# Altium footprint library Module.PcbLib: 63 footprints (part 1 of 4)
Each footprint in its own frame and in the unit in brackets; x right, y up, seen from the top. Pads: shape width x height; smd on the part's side, far side on the other; paste and mask are expansions set on the pad; w line width, h text height; cw(c..) or ccw(c..) is an arc to the next point about the centre after c.
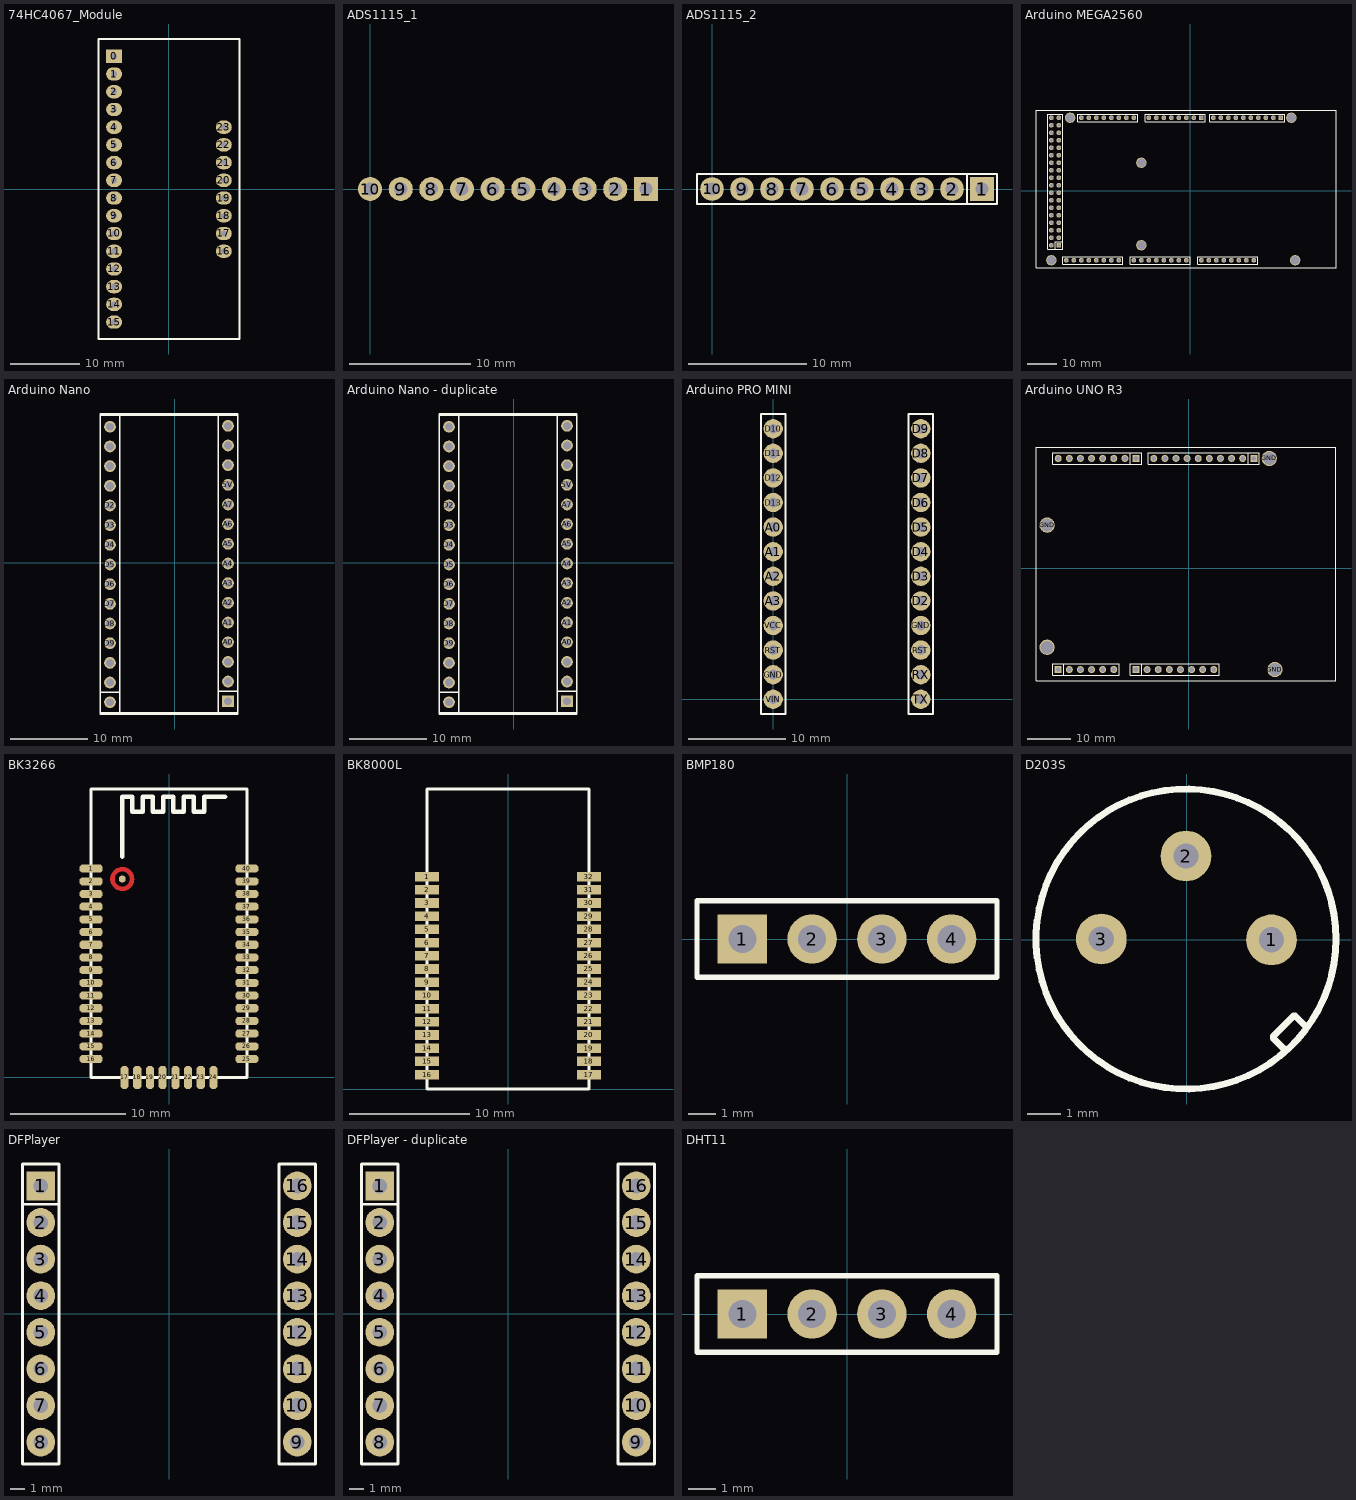
[diagram p0: the footprints below, top view; thin cyan lines are the x and y axes]

## 74HC4067_Module [mil]
pads (24):
  rect 90x75 hole 34: 0(-309.7,748.94)
  oval 90x75 hole 34: 1(-309.7,648.94) 2(-309.7,548.94) 3(-309.7,448.94) 4(-309.7,348.94) 5(-309.7,248.94) 6(-309.7,148.94) 7(-309.7,48.94) 8(-309.7,-51.06) 9(-309.7,-151.06) 10(-309.7,-251.06) 11(-309.7,-351.06) 12(-309.7,-451.06) 13(-309.7,-551.06) 14(-309.7,-651.06) 15(-309.7,-751.06) 16(309.3,-351.06) 17(309.3,-251.06) 18(309.3,-151.06) 19(309.3,-51.06) 20(309.3,48.94) 21(309.3,148.94) 22(309.3,248.94) 23(309.3,348.94)
Top Overlay:
  lines w10: -398.39,-846.46 398.39,-846.46 398.39,846.46 -398.39,846.46 -398.39,-846.46
3D body "Assem4.STEP": height 386.03, standoff -90.35, extent -359.01,-807.09 359.01,807.09

## ADS1115_1 [mm] "ADC 16bit 4Ch"
pads (10):
  rect 2x2 hole 1.1: 1(22.86,0)
  round 2 hole 1.1: 2(20.32,0) 3(17.78,0) 4(15.24,0) 5(12.7,0) 6(10.16,0) 7(7.62,0) 8(5.08,0) 9(2.54,0) 10(0,0)
3D body "61301011021.stp": height 8.37, standoff -1.99, extent -1.295,-1.27 24.105,4.27
3D body "16Bit I2C ADC+PGA - ADS1115.stp": height -6.36, standoff -23.64, extent -2.54,1.6 25.4,4.34

## ADS1115_2 [mm] "ADC 16bit 4Ch"
pads (10):
  rect 2x2 hole 1.1: 1(22.86,0)
  round 2 hole 1.1: 2(20.32,0) 3(17.78,0) 4(15.24,0) 5(12.7,0) 6(10.16,0) 7(7.62,0) 8(5.08,0) 9(2.54,0) 10(0,0)
Top Overlay:
  lines w0.2: 21.59,-1.27 21.59,1.27 ; -1.27,-1.27 22.225,-1.27 24.13,-1.27 24.13,1.27 -1.27,1.27 -1.27,-1.27
3D body "16Bit I2C ADC+PGA - ADS1115.stp": height -6, standoff -8.74, extent -2.54,-15.215 25.4,2.057
3D body "61301011121.stp": height 8.54, standoff -3, extent -1.27,-1.27 24.13,1.27

## Arduino MEGA2560 [mm]
height 8.5
pads (98):
  round 1.6 hole 1.1: 0-RX(-13.97,24.765) 1-TX(-11.43,24.765) 2(-8.89,24.765) 3V3(13.97,-23.495) 4(-3.81,24.765) 5V(-46.99,24.765) 5V(-44.45,24.765) 5V(11.43,-23.495) 8(7.874,24.765) 12(18.034,24.765) 13(20.574,24.765) 14(-19.05,24.765) 15(-21.59,24.765) 16(-24.13,24.765) 17(-26.67,24.765) 18(-29.21,24.765) 19(-31.75,24.765) 20(-34.29,24.765) 21(-36.83,24.765) 22(-44.45,22.225) 23(-46.99,22.225) 24(-44.45,19.685) 25(-46.99,19.685) 26(-44.45,17.145) 27(-46.99,17.145) 28(-44.45,14.605) 29(-46.99,14.605) 30(-44.45,12.065) 31(-46.99,12.065) 32(-44.45,9.525) 33(-46.99,9.525) 34(-44.45,6.985) 35(-46.99,6.985) 36(-44.45,4.445) 37(-46.99,4.445) 38(-44.45,1.905) 39(-46.99,1.905) 40(-44.45,-0.635) 41(-46.99,-0.635) 42(-44.45,-3.175) 43(-46.99,-3.175) 44(-44.45,-5.715) 45(-46.99,-5.715) 46(-44.45,-8.255) 47(-46.99,-8.255) 48(-44.45,-10.795) 49(-46.99,-10.795) 50(-44.45,-13.335) 51(-46.99,-13.335) 52(-44.45,-15.875) 53(-46.99,-15.875) A0(-1.27,-23.495) A1(-3.81,-23.495) A2(-6.35,-23.495) A3(-8.89,-23.495) A4(-11.43,-23.495) A5(-13.97,-23.495) A6(-16.51,-23.495) A7(-19.05,-23.495) A8(-24.13,-23.495) A9(-26.67,-23.495) A10(-29.21,-23.495) A11(-31.75,-23.495) A12(-34.29,-23.495) A13(-36.83,-23.495) A14(-39.37,-23.495) A15(-41.91,-23.495) AREF(25.654,24.765) GND(-46.99,-18.415) GND(6.35,-23.495) GND(8.89,-23.495) GND(23.114,24.765) IOREF(19.05,-23.495) RESET(16.51,-23.495) SDA(28.194,24.765) Vin(3.81,-23.495) ~3(-6.35,24.765) ~5(-1.27,24.765) ~6(1.27,24.765) ~9(10.414,24.765) ~10(12.954,24.765) ~11(15.494,24.765) ""(21.59,-23.495)
  rect 1.6x1.6 hole 1.1: 7(3.81,24.765) GND(-44.45,-18.415) SCL(30.734,24.765)
  round 3.5 hole 3: GND(-46.99,-23.495) GND(-40.64,24.765) GND(-16.51,-18.415) GND(-16.51,9.525) GND(34.29,24.765) GND(35.56,-23.495)
  round 0 all layers, no hole: ""(-46.99,-23.495) ""(-40.64,24.765) ""(-16.51,-18.415) ""(-16.51,9.525) ""(34.29,24.765) ""(35.56,-23.495)
Top Overlay:
  lines w0.2: -45.72,-19.685 -45.72,-17.145 -43.18,-17.145 ; -33.02,23.495 -17.78,23.495 ; -33.02,26.035 -17.78,26.035 ; -27.94,-24.765 -43.18,-24.765 ; -27.94,-22.225 -43.18,-22.225 ; -15.24,-24.765 0,-24.765 ; -15.24,-22.225 0,-22.225 ; -43.18,-24.765 -43.18,-22.225 ; -43.18,-24.765 -22.86,-24.765 -22.86,-22.225 -43.18,-22.225 ; -43.18,-24.765 -43.18,-22.225 ; -17.78,23.495 -17.78,26.035 ; -17.78,23.495 -38.1,23.495 -38.1,26.035 -17.78,26.035 ; -17.78,23.495 -17.78,26.035 ; 0,-24.765 0,-22.225 ; 0,-24.765 -20.32,-24.765 -20.32,-22.225 0,-22.225 ; 0,-24.765 0,-22.225 ; -52.197,-26.035 49.403,-26.035 49.403,18.796 49.403,27.305 -52.197,27.305 -52.197,24.511 -52.197,-26.035 ; -48.26,-19.685 -43.18,-19.685 -43.18,26.035 -48.26,26.035 -48.26,-19.685 ; -15.24,23.495 -15.24,26.035 5.08,26.035 5.08,23.495 -15.24,23.495 ; 2.54,-24.765 2.54,-22.225 22.86,-22.225 22.86,-24.765 2.54,-24.765 ; 6.604,23.495 30.099,23.495 32.004,23.495 32.004,26.035 6.604,26.035 6.604,23.495
3D body "61300811121.stp": height 8.54, standoff -3, extent -20.32,-24.765 0,-22.225
3D body "61300811121.stp": height 8.54, standoff -3, extent -15.24,23.495 5.08,26.035
3D body "61300811121.stp": height 8.54, standoff -3, extent 2.54,-24.765 22.86,-22.225
3D body "User Library-ARDUINO_MEGA_2560.STEP": height 15.2, standoff -0.05, extent -52.07,-26.035 55.88,27.305
3D body "61301011121.stp": height 8.54, standoff -3, extent 6.604,23.495 32.004,26.035
3D body "61300811121.stp": height 8.54, standoff -3, extent -43.18,-24.765 -22.86,-22.225
3D body "61300811121.stp": height 8.54, standoff -3, extent -38.1,23.495 -17.78,26.035
3D body "61303621121.stp": height 8.55, standoff -2.99, extent -48.26,-19.685 -43.18,26.035

## Arduino Nano [mm]
height 8.5
pads (30):
  round 1.52 hole 1.02: 3V3(6.858,-15.367) 5V(6.858,10.033) A0(6.858,-10.287) A1(6.858,-7.747) A2(6.858,-5.207) A3(6.858,-2.667) A4(6.858,-0.127) A5(6.858,2.413) A6(6.858,4.953) A7(6.858,7.493) D2(-8.382,7.366) D3(-8.382,4.826) D4(-8.382,2.286) D5(-8.382,-0.254) D6(-8.382,-2.794) D7(-8.382,-5.334) D8(-8.382,-7.874) D9(-8.382,-10.414) D10(-8.382,-12.954) D11(-8.382,-15.494) D12(-8.382,-18.034) GND(-8.382,9.906) GND(6.858,15.113) REF(6.858,-12.827) RST(-8.382,12.446) RST(6.858,12.573) RX0(-8.382,14.986) TX1(-8.382,17.526) VIN(6.858,17.653)
  rect 1.52x1.52 hole 1.02: D13(6.858,-17.907)
Top Overlay:
  lines w0.2: -9.652,-16.764 -7.112,-16.764 ; -9.652,-6.727 -9.652,-4.572 ; -9.652,-6.354 -9.652,-19.554 ; -9.652,-4.699 -9.652,19.046 -7.112,19.046 ; -9.652,18.288 -9.652,19.177 8.128,19.177 ; -8.128,-19.554 8.128,-19.554 8.128,-19.177 ; -7.112,-6.727 -7.112,19.05 8.128,19.05 8.128,19.177 ; -7.112,-6.354 -7.112,-19.554 -9.652,-19.554 ; 5.588,-16.637 8.128,-16.637 ; 5.588,-6.6 5.588,-4.445 ; 5.588,-6.227 5.588,-19.427 8.128,-19.427 8.128,-6.227 ; 5.588,-4.572 5.588,19.173 8.128,19.173 ; 6.096,-19.427 -9.652,-19.427 -9.652,-19.554 ; 8.128,-6.6 8.128,19.177
3D body "User Library-Nano-1.STEP": height 21.18, standoff 2.62, extent -9.652,-23.476 8.138,21.444
3D body "61300511821.stp": height 8.51, standoff -3.09, extent 5.608,-19.427 8.108,-6.227
3D body "61301011821.stp": height 8.51, standoff -3.09, extent 5.608,-6.727 8.108,19.173
3D body "61300511821.stp": height 8.51, standoff -3.09, extent -9.632,-19.554 -7.132,-6.354
3D body "61301011821.stp": height 8.51, standoff -3.09, extent -9.632,-6.854 -7.132,19.046

## Arduino Nano - duplicate [mm]
height 8.5
pads (30):
  round 1.52 hole 1.02: 3V3(6.858,-15.367) 5V(6.858,10.033) A0(6.858,-10.287) A1(6.858,-7.747) A2(6.858,-5.207) A3(6.858,-2.667) A4(6.858,-0.127) A5(6.858,2.413) A6(6.858,4.953) A7(6.858,7.493) D2(-8.382,7.366) D3(-8.382,4.826) D4(-8.382,2.286) D5(-8.382,-0.254) D6(-8.382,-2.794) D7(-8.382,-5.334) D8(-8.382,-7.874) D9(-8.382,-10.414) D10(-8.382,-12.954) D11(-8.382,-15.494) D12(-8.382,-18.034) GND(-8.382,9.906) GND(6.858,15.113) REF(6.858,-12.827) RST(-8.382,12.446) RST(6.858,12.573) RX0(-8.382,14.986) TX1(-8.382,17.526) VIN(6.858,17.653)
  rect 1.52x1.52 hole 1.02: D13(6.858,-17.907)
Top Overlay:
  lines w0.2: -9.652,-16.764 -7.112,-16.764 ; -9.652,-6.727 -9.652,-4.572 ; -9.652,-6.354 -9.652,-19.554 ; -9.652,-4.699 -9.652,19.046 -7.112,19.046 ; -9.652,18.288 -9.652,19.177 8.128,19.177 ; -8.128,-19.554 8.128,-19.554 8.128,-19.177 ; -7.112,-6.727 -7.112,19.05 8.128,19.05 8.128,19.177 ; -7.112,-6.354 -7.112,-19.554 -9.652,-19.554 ; 5.588,-16.637 8.128,-16.637 ; 5.588,-6.6 5.588,-4.445 ; 5.588,-6.227 5.588,-19.427 8.128,-19.427 8.128,-6.227 ; 5.588,-4.572 5.588,19.173 8.128,19.173 ; 6.096,-19.427 -9.652,-19.427 -9.652,-19.554 ; 8.128,-6.6 8.128,19.177
3D body "User Library-Nano-1.STEP": height 13.08, standoff -5.48, extent -9.652,-23.476 8.138,21.444

## Arduino PRO MINI [mm]
height 8.5
pads (24):
  round 2 hole 1.02: A0(0,17.78) A1(0,15.24) A2(0,12.7) A3(0,10.16) D2(15.24,10.16) D3(15.24,12.7) D4(15.24,15.24) D5(15.24,17.78) D6(15.24,20.32) D7(15.24,22.86) D8(15.24,25.4) D9(15.24,27.94) D10(0,27.94) D11(0,25.4) D12(0,22.86) D13(0,20.32) GND(0,2.54) GND(15.24,7.62) RST(0,5.08) RST(15.24,5.08) RX(15.24,2.54) TX(15.24,0) VCC(0,7.62) VIN(0,0)
Top Overlay:
  lines w0.2: -1.27,-1.52 -1.27,0.635 -1.27,29.46 1.27,29.46 1.27,-1.52 -1.27,-1.52 ; 13.97,-1.52 13.97,0.635 13.97,29.46 16.51,29.46 16.51,-1.52 13.97,-1.52
3D body "61301211821.stp": height 8.51, standoff -3.09, extent 13.99,-1.52 16.49,29.46
3D body "61301211821.stp": height 8.51, standoff -3.09, extent -1.25,-1.52 1.25,29.46
3D body "User Library-ARDUINO_MINI_V2.STEP": height 20.9, standoff 2.3, extent -1.502,-3.545 17.098,30.455

## Arduino UNO R3 [mm]
height 8.5
pads (40):
  round 1.6 hole 1.1: 0-RX(-29.845,25.146) 1-TX(-27.305,25.146) 2(-24.765,25.146) 3V3(-1.905,-23.114) 4(-19.685,25.146) 5V(-4.445,-23.114) 8(-8.001,25.146) 12(2.159,25.146) 13(4.699,25.146) A0(-17.145,-23.114) A1(-19.685,-23.114) A2(-22.225,-23.114) A3(-24.765,-23.114) A4(-27.305,-23.114) AREF(9.779,25.146) GND(-9.525,-23.114) GND(-6.985,-23.114) GND(7.239,25.146) IOREF(3.175,-23.114) NC(5.715,-23.114) RESET(0.635,-23.114) SDA(12.319,25.146) ~3(-22.225,25.146) ~5(-17.145,25.146) ~6(-14.605,25.146) ~9(-5.461,25.146) ~10(-2.921,25.146) ~11(-0.381,25.146)
  rect 1.6x1.6 hole 1.1: 7(-12.065,25.146) A5(-29.845,-23.114) SCL(14.859,25.146) Vin(-12.065,-23.114)
  round 3.5 hole 3: GND(-32.385,9.906) GND(18.415,25.146) GND(19.685,-23.114) ""(-32.385,-18.034)
  oval 0x2 all layers, no hole: ""(-32.385,-18.034)
  round 0 all layers, no hole: ""(-32.385,9.906) ""(18.415,25.146) ""(19.685,-23.114)
Top Overlay:
  lines w0.2: -28.575,-24.384 -28.575,-21.844 ; -13.335,23.876 -13.335,26.416 ; -10.795,-24.384 -10.795,-21.844 ; 13.589,23.876 13.589,26.416 ; -34.925,-25.654 -34.925,-8.255 -34.925,27.686 33.655,27.686 33.655,19.304 33.655,-25.654 -34.925,-25.654 ; -31.115,-24.384 -15.875,-24.384 -15.875,-21.844 -31.115,-21.844 -31.115,-24.384 ; -31.115,23.876 -10.795,23.876 -10.795,26.416 -31.115,26.416 -31.115,23.876 ; -13.335,-24.384 6.985,-24.384 6.985,-21.844 -13.335,-21.844 -13.335,-24.384 ; -9.271,23.876 -9.271,26.416 16.129,26.416 16.129,23.876 14.224,23.876 -9.271,23.876
3D body "61301011121.stp": height 8.54, standoff -3, extent -9.271,23.876 16.129,26.416
3D body "User Library-ARDUINO_UNO_R3_1.STEP": height 15.28, standoff 0.03, extent -34.925,-25.654 40.005,27.686
3D body "61300611121.stp": height 8.54, standoff -3, extent -31.115,-24.384 -15.875,-21.844
3D body "61300811121.stp": height 8.54, standoff -3, extent -13.335,-24.384 6.985,-21.844
3D body "61300811121.stp": height 8.54, standoff -3, extent -31.115,23.876 -10.795,26.416

## atzb s1 256 3.0 [mm]
height 8.5
3D body "User Library-ATZB-S1-256-3-0-C.STEP": height 3.86, standoff -0.68, extent -18.937,-11.176 11.063,8.824

## BK3266 [mm]
pads (41):
  oct 2x0.7 smd: 1(-6.75,18.1) 2(-6.75,17) 3(-6.75,15.9) 4(-6.75,14.8) 5(-6.75,13.7) 6(-6.75,12.6) 7(-6.75,11.5) 8(-6.75,10.4) 9(-6.75,9.3) 10(-6.75,8.2) 11(-6.75,7.1) 12(-6.75,6) 13(-6.75,4.9) 14(-6.75,3.8) 15(-6.75,2.7) 16(-6.75,1.6) 25(6.75,1.6) 26(6.75,2.7) 27(6.75,3.8) 28(6.75,4.9) 29(6.75,6) 30(6.75,7.1) 31(6.75,8.2) 32(6.75,9.3) 33(6.75,10.4) 34(6.75,11.5) 35(6.75,12.6) 36(6.75,13.7) 37(6.75,14.8) 38(6.75,15.9) 39(6.75,17) 40(6.75,18.1)
  oct 0.7x2 smd: 17(-3.85,0) 18(-2.75,0) 19(-1.65,0) 20(-0.55,0) 21(0.55,0) 22(1.65,0) 23(2.75,0) 24(3.85,0)
  round 0.6 smd: ""(-4.05,17.2)
Top Layer:
  circle w0.4: c-4.05,17.2 r0.85
Top Overlay:
  lines w0.254: -6.75,0 6.75,0 6.75,25 -6.75,25 -6.75,0
  lines w0.4: -4.064,19.152 -4.064,24.333 -3.175,24.333 -3.175,23.012 -2.286,23.012 -2.286,24.333 -1.397,24.333 -1.397,23.012 -0.508,23.012 -0.508,24.333 0.381,24.333 0.381,23.012 1.27,23.012 1.27,24.333 2.159,24.333 2.159,23.012 3.048,23.012 3.048,24.333 4.851,24.333

## BK8000L [mm]
pads (32):
  rect 2x0.8 smd: 1(-6.75,17.7) 2(-6.75,16.6) 3(-6.75,15.5) 4(-6.75,14.4) 5(-6.75,13.3) 6(-6.75,12.2) 7(-6.75,11.1) 8(-6.75,10) 9(-6.75,8.9) 10(-6.75,7.8) 11(-6.75,6.7) 12(-6.75,5.6) 13(-6.75,4.5) 14(-6.75,3.4) 15(-6.75,2.3) 16(-6.75,1.2) 17(6.75,1.2) 18(6.75,2.3) 19(6.75,3.4) 20(6.75,4.5) 21(6.75,5.6) 22(6.75,6.7) 23(6.75,7.8) 24(6.75,8.9) 25(6.75,10) 26(6.75,11.1) 27(6.75,12.2) 28(6.75,13.3) 29(6.75,14.4) 30(6.75,15.5) 31(6.75,16.6) 32(6.75,17.7)
Top Overlay:
  lines w0.254: -6.75,0 6.75,0 6.75,25 -6.75,25 -6.75,0

## BMP180 [mm]
height 8.5
pads (4):
  rect 1.8x1.8 hole 1.02: 1(-3.81,0)
  round 1.8 hole 1.02: 2(-1.27,0) 3(1.27,0) 4(3.81,0)
Top Overlay:
  lines w0.2: -5.461,-1.397 -5.461,1.397 5.461,1.397 5.461,-1.397 -5.461,-1.397
3D body "61300411821.stp": height 8.51, standoff -3.09, extent -5.33,-1.25 5.33,1.25
3D body "BMP180_SHIELD_13x10.5.stp": height 20.5, standoff 3.2, extent -5.25,-0.508 5.25,7.132

## D203S [mil]
height 334.65
pads (3):
  round 60 hole 30: 1(100,0) 2(-1,99) 3(-101,1)
Top Overlay:
  circle w8: c-1,1 r177.17
  lines w8: 115,-129 102,-116 102,-114 126,-90 128,-90 141,-103
3D body "User Library-PIR_S_Orginal.step": height 187.01, standoff -76.77, extent -179.13,-179.09 179.13,179.14

## DFPlayer [mm]
pads (16):
  rect 2x2 hole 1.02: 1(-8.9,8.89)
  round 2 hole 1.02: 2(-8.9,6.35) 3(-8.9,3.81) 4(-8.9,1.27) 5(-8.9,-1.27) 6(-8.9,-3.81) 7(-8.9,-6.35) 8(-8.9,-8.89) 9(8.9,-8.89) 10(8.9,-6.35) 11(8.9,-3.81) 12(8.9,-1.27) 13(8.9,1.27) 14(8.9,3.81) 15(8.9,6.35) 16(8.9,8.89)
Top Overlay:
  lines w0.2: -10.17,7.62 -7.63,7.62 ; -10.17,-10.41 -10.17,10.41 -7.63,10.41 -7.63,-10.41 -10.17,-10.41 ; 7.63,-10.41 7.63,10.41 10.17,10.41 10.17,-10.41 7.63,-10.41
3D body "61300811821.stp": height 8.51, standoff -3.09, extent 7.65,-10.41 10.15,10.41
3D body "DFPlayer Mini Assem v1.step": height 14.5, standoff 3.3, extent -10.4,-13.06 10.4,10.4
3D body "61300811821.stp": height 8.51, standoff -3.09, extent -10.15,-10.41 -7.65,10.41

## DFPlayer - duplicate [mm]
pads (16):
  rect 2x2 hole 1.02: 1(-8.9,8.89)
  round 2 hole 1.02: 2(-8.9,6.35) 3(-8.9,3.81) 4(-8.9,1.27) 5(-8.9,-1.27) 6(-8.9,-3.81) 7(-8.9,-6.35) 8(-8.9,-8.89) 9(8.9,-8.89) 10(8.9,-6.35) 11(8.9,-3.81) 12(8.9,-1.27) 13(8.9,1.27) 14(8.9,3.81) 15(8.9,6.35) 16(8.9,8.89)
Top Overlay:
  lines w0.2: -10.17,7.62 -7.63,7.62 ; -10.17,-10.41 -7.63,-10.41 -7.63,10.41 -10.17,10.41 -10.17,-10.41 ; 7.63,-10.41 10.17,-10.41 10.17,10.41 7.63,10.41 7.63,-10.41
3D body "DFPlayer Mini Assem v1.step": height 6, standoff -5.2, extent -10.4,-13.06 10.4,10.4

## DHT11 [mm]
height 8.5
pads (4):
  rect 1.8x1.8 hole 1.02: 1(-3.81,0)
  round 1.8 hole 1.02: 2(-1.27,0) 3(1.27,0) 4(3.81,0)
Top Overlay:
  lines w0.2: -5.461,-1.397 -5.461,1.397 5.461,1.397 5.461,-1.397 -5.461,-1.397
3D body "User Library-DHT11-1.step": height 26, standoff 2, extent -6.477,-3 6.523,3
3D body "61300411821.stp": height 8.51, standoff -3.09, extent -5.33,-1.25 5.33,1.25